# Altium footprint library lib_ic_FOOTPRINTS.PcbLib: 98 footprints (part 2 of 7)
Each footprint in its own frame and in the unit in brackets; x right, y up, seen from the top. Pads: shape width x height; smd on the part's side, far side on the other; paste and mask are expansions set on the pad; w line width, h text height; cw(c..) or ccw(c..) is an arc to the next point about the centre after c.
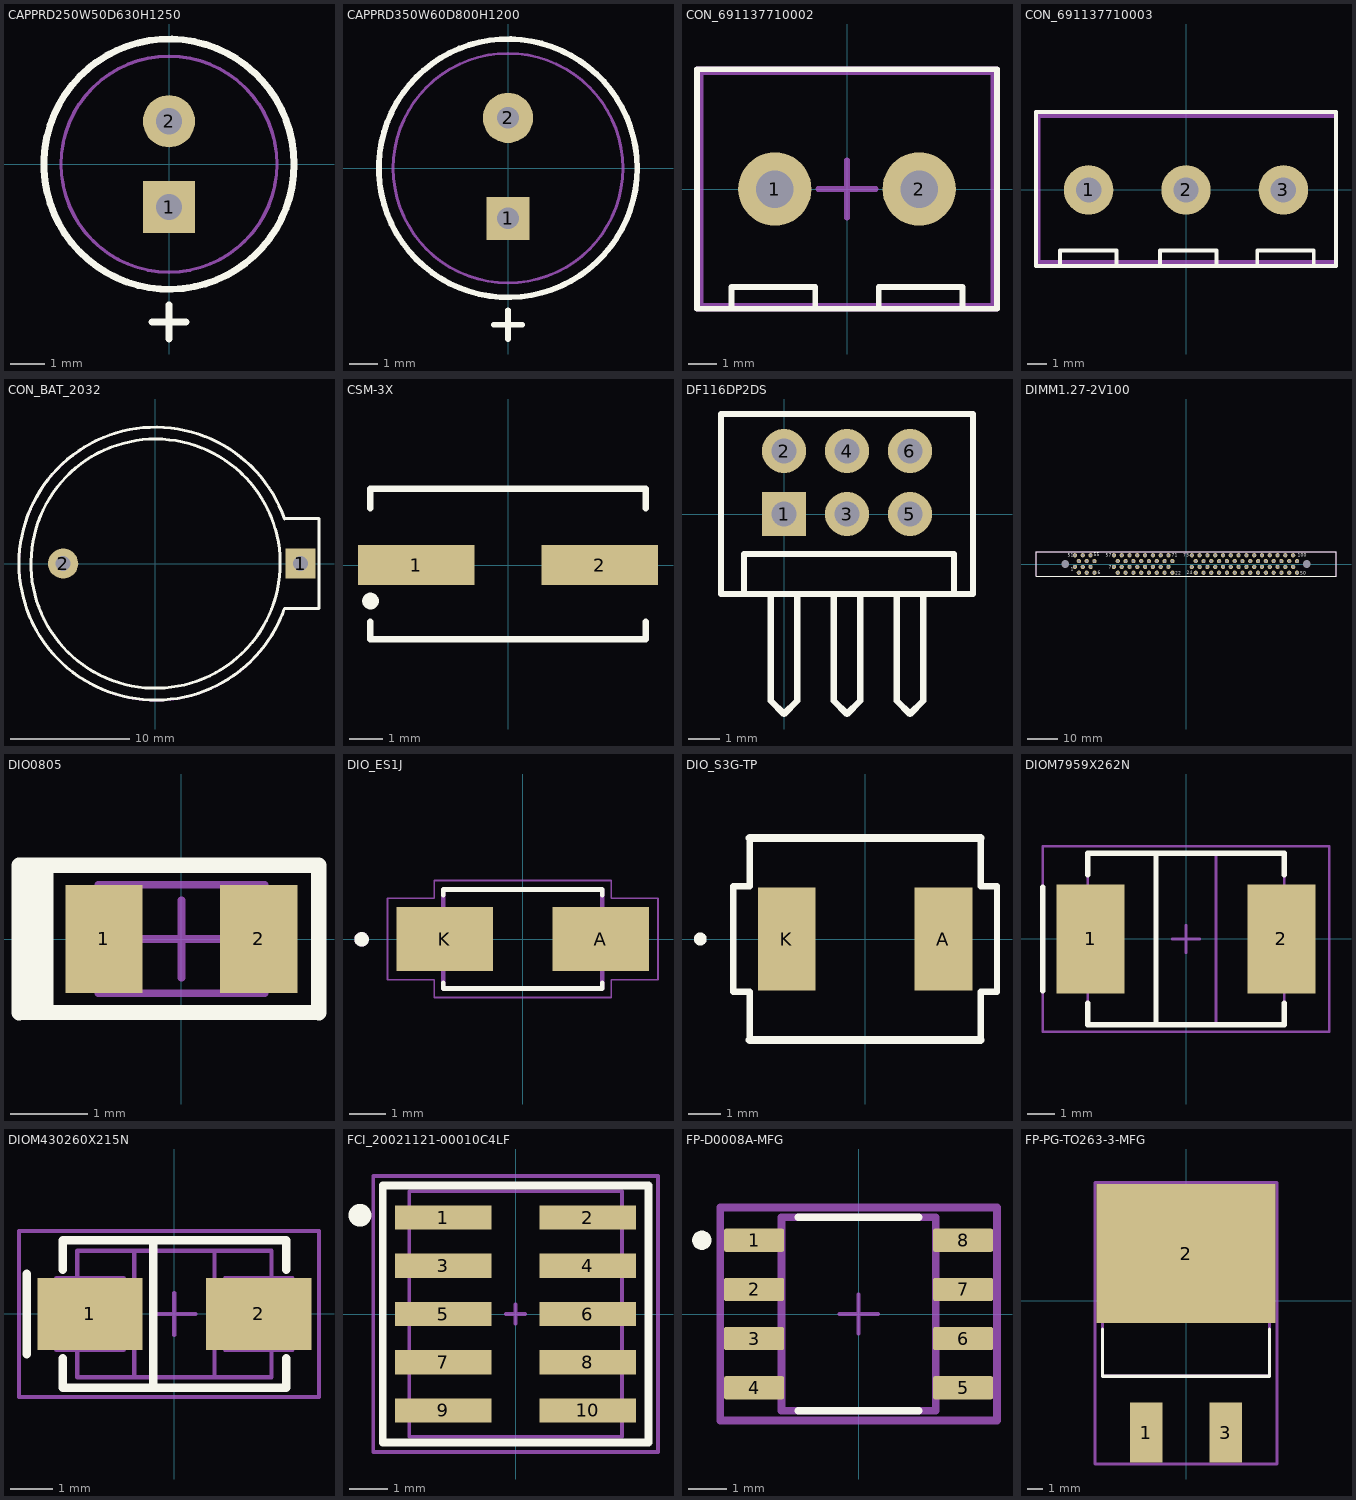
[diagram p1: the footprints below, top view; thin cyan lines are the x and y axes]

## CAPPRD250W50D630H1250 [mil] "Capacitor, Polarized Radial Diameter, 2.5 Lead Spacing, 0.5 Lead Width, 6.3 Diameter, 12.5 Height"
height 492.13
pads (2):
  rect 60x60 hole 30: 1(0,-49.21)
  round 60 hole 30: 2(0,49.21)
Top Overlay:
  circle w7.87: c0,0 r143.7
  lines w7.87: -19.68,-181.1 19.68,-181.1 ; 0,-200.79 0,-161.42
Mechanical 13:
  circle w3.94: c0,0 r124.02
Mechanical 15:
  circle w3.94: c0,0 r143.7
3D body "User Library-Cap electro 6_3x12_5x2_5mm.step": height 512.81, standoff -118.67, extent -125.01,-125.01 125.01,125.02

## CAPPRD350W60D800H1200 [mm] "Capacitor, Polarized Radial Diameter, 3.5 Lead Spacing, 0.6 Lead Width, 8.0 Diameter, 12.0 Height"
height 20
pads (2):
  rect 1.5x1.5 hole 0.75: 1(0,-1.75)
  round 1.75 hole 0.75: 2(0,1.75)
Top Overlay:
  circle w0.2: c0,0 r4.5
  lines w0.2: -0.5,-5.45 0.5,-5.45 ; 0,-5.95 0,-4.95
Mechanical 13:
  circle w0.1: c0,0 r4
Mechanical 15:
  circle w0.1: c0,0 r4.5
3D body "User Library-CapAluRadial_D80H115.STEP": height 13, standoff -3, extent -4.237,-4.25 4.237,4.214

## CON_691137710002 [mm] "Terminal Block 5.08mm pitch, vertical, 2 positions pcb mounting, Phoenix Contact"
height 10
pads (2):
  round 2.54 hole 1.3: 1(-2.5,0) 2(2.5,0)
Top Overlay:
  lines w0.2: -4,-4.15 -4,-3.4 -1.1,-3.4 -1.1,-4.15 ; 1.1,-4.15 1.1,-3.4 4,-3.4 4,-4.15 ; 5.15,-4.15 -5.2,-4.15 -5.2,4.15 5.15,4.15 ; 5.2,-4.15 5.2,4.15
Mechanical 13:
  lines w0.2: -5.08,-4.05 -5.08,4.05 5.08,4.05 5.08,-4.05 -5.08,-4.05
Mechanical 15:
  lines w0.2: -1,0 1,0 ; 0,-1 0,1 ; 5.15,-4.15 -5.2,-4.15 -5.2,4.15 5.15,4.15 ; 5.2,-4.15 5.2,4.15
3D body "1729128.stp": height 10, standoff -3.5, extent -5.65,-4.05 5.08,4.05

## CON_691137710003 [mm] "Terminal Block 5.08mm pitch, vertical, 3 positions pcb mounting, Phoenix Contact"
height 10
pads (3):
  round 2.54 hole 1.3: 1(-5,0) 2(0,0) 3(5,0)
Top Overlay:
  lines w0.2: -6.461,-3.85 -6.461,-3.1 -3.561,-3.1 -3.561,-3.85 ; -1.341,-3.85 -1.341,-3.1 1.559,-3.1 1.559,-3.85 ; 3.659,-3.85 3.659,-3.1 6.559,-3.1 6.559,-3.85 ; -7.7,-3.9 7.7,-3.9 7.7,4 -7.7,4 -7.7,-3.9
Mechanical 13:
  lines w0.2: -7.58,-3.7 7.7,-3.7 7.7,3.8 -7.58,3.8 -7.58,-3.7
Mechanical 15:
  lines w0.2: -1,0 1,0 ; 0,-1 0,1 ; -7.7,-3.7 7.7,-3.7 7.7,4 -7.7,4 -7.7,-3.7
3D body "691137710003 (rev1).stp": height 11.51, standoff -3.59, extent -7.5,-3.7 7.5,3.8

## CON_BAT_2032 [mm]
pads (2):
  rect 2.54x2.54 hole 1.27: 1(12.223,0)
  round 2.54 hole 1.27: 2(-7.778,0)
Top Overlay:
  lines w0.254: 10.506,0.063 cw(c0.006,0) 10.505,0.126 ; 10.855,-3.797 cw(c-0.001,0) 10.862,3.777 ; 10.864,-3.8 13.779,-3.8 13.779,3.8 10.928,3.8
Mechanical 13:
  lines w0.1: 10.87,3.779 ccw(c0.031,-0.064) 10.903,-3.813
Mechanical 15:
  lines w0.1: 10.855,-3.797 cw(c-0.001,0) 10.862,3.777
3D body "User Library-CR2032_HOR_HOLD.STEP": height 8.5, standoff -4, extent -11.254,-11.064 13.246,10.937

## CSM-3X [mm] "Quartz Crystal, SM; Body 7.00 mm x 4.10 mm x 2.30 mm"
height 4.3
pads (2):
  rect 3.5x1.2 smd: 1(-2.75,0) 2(2.75,0)
Top Overlay:
  circle w0.25: c-4.126,-1.079 r0.125
  lines w0.2: -4.127,-1.7 -4.127,-2.222 4.127,-2.222 4.127,-1.7 ; -4.127,1.7 -4.127,2.286 4.127,2.286 4.127,1.7
3D body "User Library-CSM-3X.STEP": height 2.3, standoff 0, extent -3.8,-2.032 3.8,2.068

## DF116DP2DS [mm]
pads (6):
  rect 1.4x1.4 hole 0.8: 1(0,0)
  round 1.4 hole 0.8: 2(0,2) 3(2,0) 4(2,2) 5(4,0) 6(4,2)
Top Overlay:
  lines w0.2: -0.423,-2.54 -0.423,-5.927 0,-6.35 0.423,-5.927 0.423,-2.54 ; 1.577,-2.54 1.577,-5.927 2,-6.35 2.423,-5.927 2.423,-2.54 ; 3.577,-2.54 3.577,-5.927 4,-6.35 4.424,-5.927 4.424,-2.54 ; -2,-2.54 -2,3.175 6,3.175 6,-2.54 -2,-2.54 ; -1.27,-2.54 -1.27,-1.27 5.397,-1.27 5.397,-2.54 -1.27,-2.54
3D body "47351.stp": height 4.21, standoff -2.39, extent -0.968,-5.714 5.032,2.286

## DIMM1.27-2V100 [mm] "Connector; DIMM II; 100 Position; Vertical"
height 23.82
pads (102):
  round 1.4 hole 0.81: 1(-36.195,-0.95) 2(-34.925,-2.85) 3(-33.655,-0.95) 4(-32.385,-2.85) 5(-31.115,-0.95) 6(-29.845,-2.85) 7(-23.495,-0.95) 8(-22.225,-2.85) 9(-20.955,-0.95) 10(-19.685,-2.85) 11(-18.415,-0.95) 12(-17.145,-2.85) 13(-15.875,-0.95) 14(-14.605,-2.85) 15(-13.335,-0.95) 16(-12.065,-2.85) 17(-10.795,-0.95) 18(-9.525,-2.85) 19(-8.255,-0.95) 20(-6.985,-2.85) 21(-5.715,-0.95) 22(-4.445,-2.85) 23(1.905,-0.95) 24(3.175,-2.85) 25(4.445,-0.95) 26(5.715,-2.85) 27(6.985,-0.95) 28(8.255,-2.85) 29(9.525,-0.95) 30(10.795,-2.85) 31(12.065,-0.95) 32(13.335,-2.85) 33(14.605,-0.95) 34(15.875,-2.85) 35(17.145,-0.95) 36(18.415,-2.85) 37(19.685,-0.95) 38(20.955,-2.85) 39(22.225,-0.95) 40(23.495,-2.85) 41(24.765,-0.95) 42(26.035,-2.85) 43(27.305,-0.95) 44(28.575,-2.85) 45(29.845,-0.95) 46(31.115,-2.85) 47(32.385,-0.95) 48(33.655,-2.85) 49(34.925,-0.95) 50(36.195,-2.85) 51(-36.195,2.85) 52(-34.925,0.95) 53(-33.655,2.85) 54(-32.385,0.95) 55(-31.115,2.85) 56(-29.845,0.95) 57(-23.495,2.85) 58(-22.225,0.95) 59(-20.955,2.85) 60(-19.685,0.95) 61(-18.415,2.85) 62(-17.145,0.95) 63(-15.875,2.85) 64(-14.605,0.95) 65(-13.335,2.85) 66(-12.065,0.95) 67(-10.795,2.85) 68(-9.525,0.95) 69(-8.255,2.85) 70(-6.985,0.95) 71(-5.715,2.85) 72(-4.445,0.95) 73(1.905,2.85) 74(3.175,0.95) 75(4.445,2.85) 76(5.715,0.95) 77(6.985,2.85) 78(8.255,0.95) 79(9.525,2.85) 80(10.795,0.95) 81(12.065,2.85) 82(13.335,0.95) 83(14.605,2.85) 84(15.875,0.95) 85(17.145,2.85) 86(18.415,0.95) 87(19.685,2.85) 88(20.955,0.95) 89(22.225,2.85) 90(23.495,0.95) 91(24.765,2.85) 92(26.035,0.95) 93(27.305,2.85) 94(28.575,0.95) 95(29.845,2.85) 96(31.115,0.95) 97(32.385,2.85) 98(33.655,0.95) 99(34.925,2.85) 100(36.195,0.95)
  round 0 hole 2.54: 101(-39.365,0) 102(39.365,0)
Top Overlay:
  lines w0.2: -48.9,-4 -48.9,4 48.9,4 48.9,-4 -48.9,-4
  text "1" at -37.529,-2.222 h1.02
  text "51" at -38.544,2.413 h1.02
  text "6" at -28.765,-3.365 h1.02
  text "55" at -30.099,2.476 h1.02
  text "7" at -25.209,-1.587 h1.02
  text "57" at -26.162,2.349 h1.02
  text "22" at -3.429,-3.429 h1.02
  text "71" at -4.572,2.349 h1.02
  text "24" at 0.318,-3.302 h1.02
  text "73" at -0.889,2.413 h1.02
  text "100" at 36.449,2.286 h1.02
  text "50" at 37.274,-3.429 h1.02
Mechanical 13:
  lines w0.1: -48.9,-4 48.9,-4 48.9,4 -48.9,4 -48.9,-4
3D body: height 23.82, standoff 0, extent -48.9,-4 48.9,4

## DIO0805 [mm] "Chip Capacitor, 0805, Body 2.0x1.3mm, IPC Medium Density"
height 1.1
pads (2):
  rect 1x1.4 smd: 1(-1,0) 2(1,0)
Top Overlay:
  rectangle: -2.095,-0.953 -1.651,0.953
  lines w0.2: -2.098,-0.953 -2.098,0.953 ; -2.095,-0.948 1.778,-0.953 ; -2.095,0.953 1.775,0.953 1.775,-0.953
Mechanical 13:
  lines w0.1: -1.075,-0.7 -1.075,0.7 1.075,0.7 1.075,-0.7 -1.075,-0.7
Mechanical 15:
  lines w0.1: -0.5,0 0.5,0 ; 0,-0.5 0,0.5 ; -1.75,-0.95 -1.75,0.95 1.75,0.95 1.75,-0.95 -1.75,-0.95
3D body "29530.stp": height 0.8, standoff 0, extent -1,-0.625 1,0.625

## DIO_ES1J [mm]
pads (2):
  rect 2.65x1.75 smd: A(2.15,0) K(-2.15,0)
Top Overlay:
  circle w0.2: c-4.44,-0.01 r0.1
  lines w0.127: -2.187,-1.2 -2.187,-1.362 2.187,-1.362 2.187,-1.2 ; -2.187,1.2 -2.187,1.362 2.187,1.362 2.187,1.2
Mechanical 13:
  circle w0.2: c-4.44,-0.01 r0.1
  lines w0.127: -2.187,-1.362 -2.187,1.362 2.187,1.362 2.187,-1.362 -2.187,-1.362
Mechanical 15:
  lines w0.05: -3.725,-1.125 -3.725,1.125 -2.438,1.125 -2.438,1.613 2.438,1.613 2.438,1.125 3.725,1.125 3.725,-1.125 2.438,-1.125 2.438,-1.613 -2.438,-1.613 -2.438,-1.125 -3.725,-1.125
3D body "ES1J.STEP": height 2.7, standoff 0, extent -2.6,-1.363 2.6,1.362

## DIO_S3G-TP [mil]
pads (2):
  rect 70x125 smd: A(95,0) K(-95,0)
Top Overlay:
  circle w7.87: c-200,0 r3.94
  lines w7.87: -140,-122.5 -140,-64 -160,-64 -160,64 -140,64 -140,122.5 ; 140,-122.5 140,-64 160,-64 160,64 140,64 140,122.5
  lines w10: -140,-122.5 140,-122.5 ; -140,122.5 140,122.5
3D body "S3G.STEP": height 100.44, standoff -2.31, extent -156.5,-116.14 156.5,116.14

## DIOM7959X262N [mm] "Molded Diode, JEDEC DO-214AB (SMC), 7.9mmX5.9mm"
height 2.62
pads (2):
  rect 2.5x4 smd: 1(-3.5,0) 2(3.5,0)
Top Overlay:
  lines w0.2: -5.25,-1.9 -5.25,1.9 ; -3.6,-2.35 -3.6,-3.15 3.6,-3.15 3.6,-2.35 ; -3.6,2.35 -3.6,3.15 3.6,3.15 3.6,2.35 ; -1.1,-3.15 -1.1,3.15
Mechanical 13:
  lines w0.1: -4.1,-1.6 -2.5,-1.6 -2.5,1.6 -4.1,1.6 -4.1,-1.6 ; -3.6,-3.15 3.6,-3.15 3.6,3.15 -3.6,3.15 -3.6,-3.15 ; -1.1,-3.15 -1.1,3.15 1.1,3.15 1.1,-3.15 -1.1,-3.15 ; 2.5,-1.6 2.5,1.6 4.1,1.6 4.1,-1.6 2.5,-1.6
Mechanical 15:
  lines w0.1: -0.5,0 0.5,0 ; 0,-0.5 0,0.5 ; -5.25,-3.4 5.25,-3.4 5.25,3.4 -5.25,3.4 -5.25,-3.4
3D body "SW3dPS-DO-214AB SMC.STEP": height 2.3, standoff 0, extent -3.975,-2.95 3.975,2.95

## DIOM430260X215N [mm] "SMA (DO-214AC) // Source: AP02001 Rev. 37 - Recommended Pad Layout per IPC-7351A, Diodes Inc"
height 2.15
pads (2):
  rect 2.5x1.7 smd: 1(-2,0) 2(2,0)
Top Overlay:
  lines w0.2: -3.5,-0.95 -3.5,0.95 ; -2.65,-1.05 -2.65,-1.75 2.65,-1.75 2.65,-1.05 ; -2.65,1.05 -2.65,1.75 2.65,1.75 2.65,1.05 ; -0.506,-1.75 -0.506,1.75
Mechanical 13:
  lines w0.1: -2.8,-0.85 -2.8,0.85 -1.2,0.85 -1.2,-0.85 -2.8,-0.85 ; -2.3,-1.5 -2.3,1.5 2.3,1.5 2.3,-1.5 -2.3,-1.5 ; -0.95,-1.5 0.95,-1.5 0.95,1.5 -0.95,1.5 -0.95,-1.5 ; 1.2,-0.85 2.8,-0.85 2.8,0.85 1.2,0.85 1.2,-0.85
Mechanical 15:
  lines w0.1: -0.5,0 0.5,0 ; 0,-0.5 0,0.5 ; -3.683,-1.968 -3.683,1.968 3.429,1.968 3.429,-1.969 -3.683,-1.968
3D body "SW3dPS-DO-214AC SMA.STEP": height 2.5, standoff 0.1, extent -2.6,-1.3 2.6,1.3

## FCI_20021121-00010C4LF [mm] "CONNECTOR, MICRO TERMINAL STRIP, 10POS, 2ROW, 1.27MM"
height 3.05
pads (10):
  rect 2.54x0.635 smd: 1(-1.905,2.54) 2(1.905,2.54) 3(-1.905,1.27) 4(1.905,1.27) 5(-1.905,0) 6(1.905,0) 7(-1.905,-1.27) 8(1.905,-1.27) 9(-1.905,-2.54) 10(1.905,-2.54)
Top Overlay:
  circle w0.5: c-4.1,2.6 r0.05
  lines w0.2: -3.5,-3.385 3.5,-3.385 3.5,3.385 -3.5,3.385 -3.5,-3.385
Mechanical 13:
  lines w0.1: -2.8,-3.235 2.8,-3.235 2.8,3.235 -2.8,3.235 -2.8,-3.235
Mechanical 15:
  lines w0.1: -0.25,0 0.25,0 ; 0,-0.25 0,0.25 ; -3.75,-3.635 3.75,-3.635 3.75,3.635 -3.75,3.635 -3.75,-3.635
3D body "20021121-00010XXLFc_HDR_SMD_5x2_50mil.stp": height 4.48, standoff -0.02, extent -2.75,-3.185 2.75,3.165

## FP-D0008A-MFG [mm]
pads (8):
  rrect17% 1.55x0.6 smd paste+0 mask+0: 1(-2.7,1.905) 2(-2.7,0.635) 3(-2.7,-0.635) 4(-2.7,-1.905) 5(2.7,-1.905) 6(2.7,-0.635) 7(2.7,0.635) 8(2.7,1.905)
Top Overlay:
  circle w0.25: c-4.05,1.905 r0.125
  lines w0.2: -1.55,-2.5 1.55,-2.5 ; -1.55,2.5 1.55,2.5
Mechanical 5:
  lines w0.2: -3.575,-2.75 -3.575,2.75 3.575,2.75 3.575,-2.75 -3.575,-2.75
  text ".Designator" at 0,0.188 h1
Mechanical 13:
  lines w0.2: -1.99,-2.5 -1.99,2.5 1.99,2.5 1.99,-2.5 -1.99,-2.5
Mechanical 15:
  lines w0.2: -3.575,-2.75 -3.575,2.75 3.575,2.75 3.575,-2.75 -3.575,-2.75
Mechanical 16:
  lines w0.1: -0.5,0 0.5,0 ; 0,-0.5 0,0.5
3D body "IC_Texas_Instruments_INA282AIDR_eec.STEP": height 0.25, standoff 0, extent -3.575,-2.75 3.575,2.75

## FP-PG-TO263-3-MFG [mm]
pads (3):
  rect 2.08x3.81 smd paste+0 mask+0: 1(-2.54,-8.417) 3(2.54,-8.417)
  rect 11.43x8.89 smd paste+0 mask+0: 2(0,3.013)
Top Overlay:
  lines w0.2: -5.335,-1.807 -5.335,-4.825 5.335,-4.825 5.335,-1.807
Mechanical 5:
  lines w0.2: -5.815,-10.422 5.815,-10.422 5.815,7.558 -5.815,7.558 -5.815,-10.422
  text ".Designator" at 0,-1.433 h1
Mechanical 13:
  lines w0.2: -5.335,-4.825 5.335,-4.825 5.335,4.825 -5.335,4.825 -5.335,-4.825
Mechanical 15:
  lines w0.2: -5.815,-10.422 5.815,-10.422 5.815,7.558 -5.815,7.558 -5.815,-10.422
Mechanical 16:
  lines w0.1: -0.5,0 0.5,0 ; 0,-0.5 0,0.5
3D body "Trans_Infineon_Technologies_IRF3205STRLPBF_eec.STEP": height 0.25, standoff 0, extent -5.815,-10.422 5.815,7.558